# Altium footprint library Ultrascale_PcbLib.PcbLib: 126 footprints (part 3 of 8)
Each footprint in its own frame and in the unit in brackets; x right, y up, seen from the top. Pads: shape width x height; smd on the part's side, far side on the other; paste and mask are expansions set on the pad; w line width, h text height; cw(c..) or ccw(c..) is an arc to the next point about the centre after c.
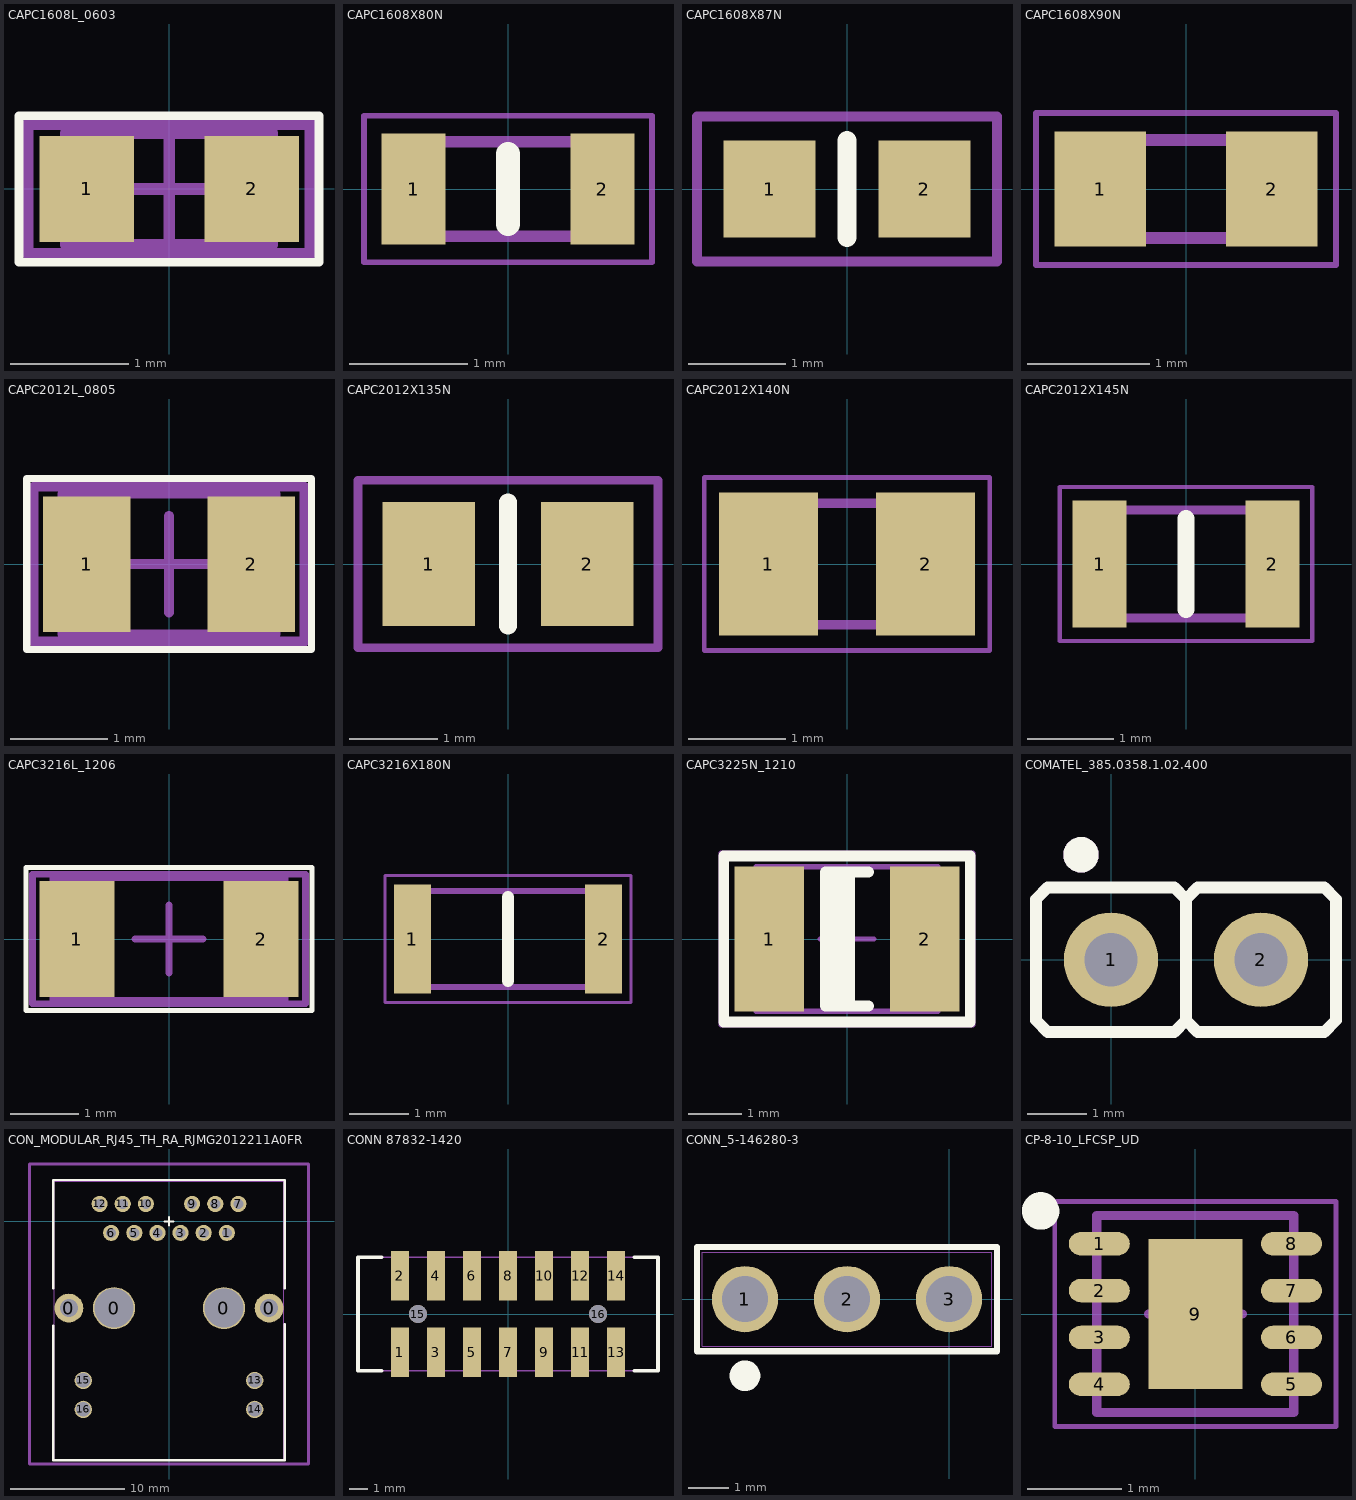
[diagram p2: the footprints below, top view; thin cyan lines are the x and y axes]

## CAPC1608L_0603 [mm] "Chip Capacitor, Body 1.6x0.8mm, IPC High Density"
height 0.85
pads (2):
  rect 0.8x0.9 smd: 1(-0.7,0) 2(0.7,0)
Top Overlay:
  lines w0.075: -1.275,-0.622 -1.275,0.62 1.271,0.62 1.271,-0.622 -1.275,-0.622
Mechanical 13:
  lines w0.1: -0.875,-0.475 -0.875,0.475 0.875,0.475 0.875,-0.475 -0.875,-0.475
Mechanical 15:
  lines w0.1: -0.475,0 0.475,0 ; 0,-0.475 0,0.475 ; -1.2,-0.55 -1.2,0.55 1.2,0.55 1.2,-0.55 -1.2,-0.55
3D body "User Library-SMD CAPACITOR0603.STEP": height 0.8, standoff 0, extent -0.8,-0.4 0.8,0.4

## CAPC1608X80N [mm] "CAP CER 22UF 10V 20% X5R 0603"
pads (2):
  rect 0.54x0.94 smd: 1(-0.8,0) 2(0.8,0)
Top Overlay:
  lines w0.2: 0,-0.3 0,0.3
Mechanical 15:
  lines w0.1: -0.8,-0.4 -0.8,0.4 0.8,0.4 0.8,-0.4 -0.8,-0.4
Mechanical 20:
  lines w0.05: -1.22,-0.62 -1.22,0.62 1.22,0.62 1.22,-0.62 -1.22,-0.62
3D body "C1608X5R1A226M080AC.stp": height 0.8, standoff 0, extent -0.8,-0.4 0.8,0.4

## CAPC1608X87N [mm] "Chip Capacitor, Body 1.6x0.8mm IPC Medium Density"
height 0.87
pads (2):
  rect 0.95x1 smd: 1(-0.8,0) 2(0.8,0)
Top Overlay:
  lines w0.2: 0,-0.5 0,0.5
Mechanical 4:
  lines w0.1: -1.55,-0.75 -1.55,0.75 1.55,0.75 1.55,-0.75 -1.55,-0.75
  text ".Designator" at -1.5,-0.825 h0.8
3D body "CAPC1608X87N.stp": height 0.87, standoff 0, extent -0.875,-0.475 0.875,0.475

## CAPC1608X90N [mm]
pads (2):
  rect 0.75x0.94 smd: 1(-0.7,0) 2(0.7,0)
Mechanical 15:
  lines w0.1: -0.8,-0.4 -0.8,0.4 0.8,0.4 0.8,-0.4 -0.8,-0.4
Mechanical 20:
  lines w0.05: -1.225,-0.62 -1.225,0.62 1.225,0.62 1.225,-0.62 -1.225,-0.62
3D body "GRM188R61E225KA12D.stp": height 0.9, standoff 0, extent -0.8,-0.4 0.8,0.4

## CAPC2012L_0805 [mm] "Chip Capacitor, Body 2.0x1.3mm, IPC High Density"
height 1.1
pads (2):
  rect 0.9x1.4 smd: 1(-0.85,0) 2(0.85,0)
Top Overlay:
  lines w0.075: -1.471,-0.883 1.473,-0.883 1.473,0.884 -1.471,0.884 -1.471,-0.883
Mechanical 13:
  lines w0.1: -1.1,-0.725 1.1,-0.725 1.1,0.725 -1.1,0.725 -1.1,-0.725
Mechanical 15:
  lines w0.1: -0.5,0 0.5,0 ; 0,-0.5 0,0.5 ; -1.4,-0.8 1.4,-0.8 1.4,0.8 -1.4,0.8 -1.4,-0.8
3D body "capc0805-x6.STEP": height 1.15, standoff 0, extent -1.134,-0.728 1.134,0.728

## CAPC2012X135N [mm] "Chip Capacitor, Body 2.0x1.25mm, IPC Medium Density"
height 1.35
pads (2):
  rect 1.05x1.4 smd: 1(-0.9,0) 2(0.9,0)
Top Overlay:
  lines w0.2: 0,-0.7 0,0.7
Mechanical 4:
  lines w0.1: -1.7,-0.95 -1.7,0.95 1.7,0.95 1.7,-0.95 -1.7,-0.95
  text ".Designator" at -1.6,-0.85 h1
3D body "CAPC2012X135N.stp": height 1.25, standoff 0, extent -1.05,-0.675 1.05,0.675

## CAPC2012X140N [mm] "CAP CER 4.7UF 25V 10% X5R 0805"
pads (2):
  rect 1.02x1.47 smd: 1(-0.81,0) 2(0.81,0)
Mechanical 15:
  lines w0.1: -1.005,-0.625 1.005,-0.625 1.005,0.625 -1.005,0.625 -1.005,-0.625
Mechanical 20:
  lines w0.05: -1.47,-0.89 1.47,-0.89 1.47,0.89 -1.47,0.89 -1.47,-0.89
3D body "08053D475KAT2A.stp": height 1.4, standoff 0, extent -1.005,-0.625 1.005,0.625

## CAPC2012X145N [mm] "CAP CER 22UF 25V 20% X5R 0805"
pads (2):
  rect 0.62x1.47 smd: 1(-1,0) 2(1,0)
Top Overlay:
  lines w0.2: 0,-0.525 0,0.525
Mechanical 15:
  lines w0.1: -1,-0.625 1,-0.625 1,0.625 -1,0.625 -1,-0.625
Mechanical 20:
  lines w0.05: -1.46,-0.89 1.46,-0.89 1.46,0.89 -1.46,0.89 -1.46,-0.89
3D body "C2012X5R1E226M125AC.stp": height 1.45, standoff 0, extent -1,-0.625 1,0.625

## CAPC3216L_1206 [mm] "Chip Capacitor, Body 3.2x1.6mm, IPC High Density"
height 1.8
pads (2):
  rect 1.1x1.7 smd: 1(-1.35,0) 2(1.35,0)
Top Overlay:
  lines w0.075: -2.1,-1.05 -2.1,1.05 2.1,1.05 2.1,-1.05 -2.1,-1.05
Mechanical 13:
  lines w0.1: -1.7,-0.9 1.7,-0.9 1.7,0.9 -1.7,0.9 -1.7,-0.9
Mechanical 15:
  lines w0.1: -0.5,0 0.5,0 ; 0,-0.5 0,0.5 ; -2,-0.95 2,-0.95 2,0.95 -2,0.95 -2,-0.95
3D body "User Library-CAPC3216X10.STEP": height 1, standoff 0, extent -1.6,-0.8 1.6,0.8
3D body: height 1.8, standoff 0, extent -1.7,-0.9 1.7,0.9

## CAPC3216X180N [mm] "CAP CER 47UF 16V 20% X5R 1206"
pads (2):
  rect 0.62x1.82 smd: 1(-1.6,0) 2(1.6,0)
Top Overlay:
  lines w0.2: 0,-0.7 0,0.7
Mechanical 15:
  lines w0.1: -1.6,-0.8 1.6,-0.8 1.6,0.8 -1.6,0.8 -1.6,-0.8
Mechanical 20:
  lines w0.05: -2.06,-1.06 2.06,-1.06 2.06,1.06 -2.06,1.06 -2.06,-1.06
3D body "C3216X5R1C476M160AB.stp": height 1.8, standoff 0, extent -1.6,-0.8 1.6,0.8

## CAPC3225N_1210 [mm] "Chip Capacitor, Body 3.2x2.5mm, IPC Medium Density"
height 2.7
pads (2):
  rect 1.3x2.7 smd: 1(-1.45,0) 2(1.45,0)
Top Overlay:
  rectangle: -0.4,-1.25 0.15,1.25
  lines w0.2: 0.4,-1.25 -0.4,-1.25 -0.4,1.25 0.4,1.25 ; -2.3,-1.55 -2.3,1.55 2.3,1.55 2.3,-1.55 -2.3,-1.55
Mechanical 13:
  lines w0.1: -1.7,-1.35 -1.7,1.35 1.7,1.35 1.7,-1.35 -1.7,-1.35
Mechanical 15:
  lines w0.1: -0.5,0 0.5,0 ; 0,-0.5 0,0.5 ; -2.35,-1.6 -2.35,1.6 2.35,1.6 2.35,-1.6 -2.35,-1.6
3D body: height 2.7, standoff 0, extent -1.7,-1.35 1.7,1.35

## COMATEL_385.0358.1.02.400 [mm] "2 Contacts Straight Strip Header Pitch 2.54mm L=6.3mm ''Mini-Wire-Wrap''"
height 8
pads (2):
  round 1.6 hole 0.9: 1(0,0) 2(2.54,0)
Top Overlay:
  circle w0.3: c-0.508,1.778 r0.15
  lines w0.2: 1.27,-1.025 1.07,-1.225 -1.07,-1.225 -1.27,-1.025 -1.27,1.025 -1.07,1.225 1.07,1.225 1.27,1.025 ; 1.27,-1.025 1.27,1.025 ; 1.27,-1.025 1.47,-1.225 3.61,-1.225 3.81,-1.025 3.81,1.025 3.61,1.225 1.47,1.225 1.27,1.025
Mechanical 14:
  circle w0.3: c-0.508,1.778 r0.15
  lines w0.1: 1.27,-1.025 1.07,-1.225 -1.07,-1.225 -1.27,-1.025 -1.27,1.025 -1.07,1.225 1.07,1.225 1.27,1.025 ; 1.27,-1.025 1.27,1.025 ; 1.27,-1.025 1.47,-1.225 3.61,-1.225 3.81,-1.025 3.81,1.025 3.61,1.225 1.47,1.225 1.27,1.025
3D body "COMATEL_385.0358.1.02.400.stp": height 8, standoff -3.2, extent -1.27,-1.225 3.81,1.225

## CON_MODULAR_RJ45_TH_RA_RJMG2012211A0FR [mm]
pads (20):
  round 2.54 hole 1.57: 0(-8.79,-7.62) 0(8.79,-7.62)
  round 3.683 hole 3.4: 0(-4.825,-7.62) 0(4.825,-7.62)
  round 1.422 hole 0.89: 1(5.075,-1.02) 2(3.045,-1.02) 3(1.015,-1.02) 4(-1.015,-1.02) 5(-3.045,-1.02) 6(-5.075,-1.02) 7(6.09,1.52) 8(4.06,1.52) 9(2.03,1.52) 10(-2.03,1.52) 11(-4.06,1.52) 12(-6.09,1.52)
  round 1.524 hole 1.27: 13(7.52,-13.97) 14(7.52,-16.51) 15(-7.52,-13.97) 16(-7.52,-16.51)
Top Overlay:
  lines w0.178: -0.381,0 0,0 ; 0,-0.381 0,0 ; 0,0.381 0,0 ; 0.381,0 0,0
  lines w0.2: -10.15,-9.178 -10.15,-20.98 10.15,-20.98 10.15,-9.028 ; -10.15,-5.9 -10.15,3.62 10.15,3.62 10.15,-5.9
Mechanical 11:
  lines w0.1: -10.05,-20.88 -10.05,3.52 10.05,3.52 10.05,-20.88 -10.05,-20.88
Mechanical 15:
  lines w0.254: -12.25,4.95 -12.25,-21.3 12.25,-21.3 12.25,5.025 -12.25,5.025

## CONN 87832-1420 [mm] "CONN HEADER 14POS 2MM VERT SMD"
pads (16):
  rect 1x2.75 smd: 1(-6,-2.125) 2(-6,2.125) 3(-4,-2.125) 4(-4,2.125) 5(-2,-2.125) 6(-2,2.125) 7(0,-2.125) 8(0,2.125) 9(2,-2.125) 10(2,2.125) 11(4,-2.125) 12(4,2.125) 13(6,-2.125) 14(6,2.125)
  round 1 hole 1 unplated: 15(-5,0) 16(5,0)
Top Overlay:
  lines w0.2: -7,-3.15 -8.325,-3.15 -8.325,3.15 -7,3.15 ; 7,-3.15 8.325,-3.15 8.325,3.15 7,3.15
Mechanical 15:
  lines w0.1: -8.325,-3.15 -8.325,3.15 8.325,3.15 8.325,-3.15 -8.325,-3.15
3D body "87832-1420.stp": height 7.61, standoff -0.99, extent -8.325,-3.15 8.325,3.15

## CONN_5-146280-3 [mil]
pads (3):
  round 65 / inner round 60 / far side round 65 hole 45: 1(-200,0) 2(-100,0) 3(0,0)
Top Overlay:
  circle w20: c-200,-75 r5
  lines w6: -247,-51 -247,51 47,51 47,-51 -247,-51
Mechanical 13:
  lines w1: -242,-46 -242,46 42,46 42,-46 -242,-46
3D body: height 10, standoff 0, extent 0,0 10,10

## CP-8-10_LFCSP_UD [mm] "Analog Devices CP-8-10 2mmx2mm Package"
height 0.6
pads (9):
  oval 0.65x0.25 smd paste+0 mask+0.05: 1(-1.025,0.75) 2(-1.025,0.25) 3(-1.025,-0.25) 6(1.025,-0.25) 7(1.025,0.25) 8(1.025,0.75)
  oval 0.65x0.25 smd mask+0.05: 4(-1.025,-0.75) 5(1.025,-0.75)
  rect 1x1.6 smd paste-0.025 mask+0.05: 9(0,0)
Top Overlay:
  lines w0.3: -1.615,1.135 ccw(c-1.65,1.1) -1.6,1.1
Mechanical 13:
  lines w0.1: -1.05,-1.05 -1.05,1.05 1.05,1.05 1.05,-1.05 -1.05,-1.05
Mechanical 15:
  lines w0.05: -1.5,-1.2 -1.5,1.2 1.5,1.2 1.5,-1.2 -1.5,-1.2
  lines w0.1: -0.5,0 0.5,0 ; 0,-0.5 0,0.5
3D body: height 0.6, standoff 0, extent -1.05,-1.05 1.05,1.05
3D body: height 0.61, standoff 0.6, extent -0.8,0.5 -0.5,0.8